# Altium footprint library Devkit.PcbLib: 84 footprints (part 6 of 6)
Each footprint in its own frame and in the unit in brackets; x right, y up, seen from the top. Pads: shape width x height; smd on the part's side, far side on the other; paste and mask are expansions set on the pad; w line width, h text height; cw(c..) or ccw(c..) is an arc to the next point about the centre after c.
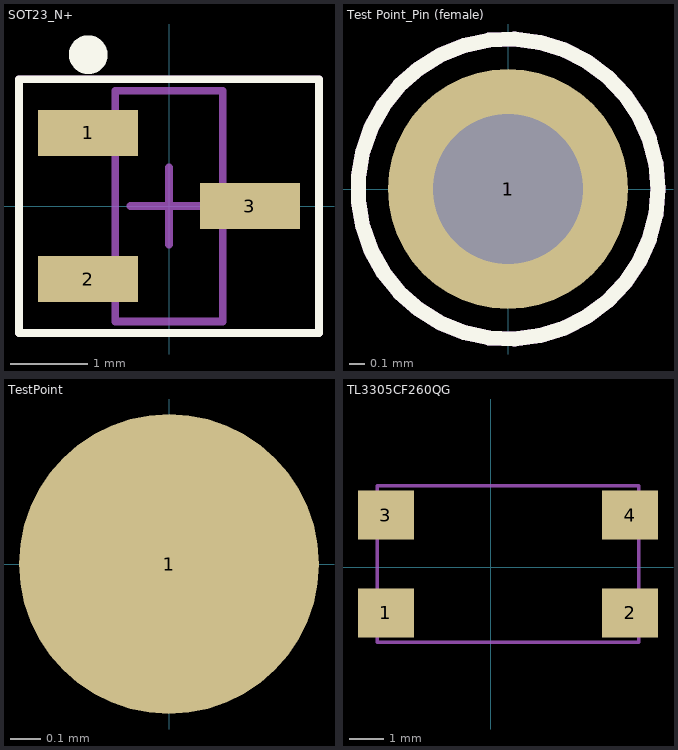
[diagram p5: the footprints below, top view; thin cyan lines are the x and y axes]

## SOT23_N+ [mm] "SOT23, 3-Leads, Body 2.9x1.3mm, Pitch 0.95mm, Lead Span 2.3mm, IPC Medium Density"
height 1.1
pads (3):
  rect 1.3x0.6 smd: 1(-1.05,0.95) 2(-1.05,-0.95) 3(1.05,0)
Top Overlay:
  lines w0.1: -1.95,-1.65 -1.95,1.65 1.95,1.65 1.95,-1.65 -1.95,-1.65
  lines w0.254: -0.927,1.943 cw(c-1.05,1.968) -0.926,1.985
Mechanical 13:
  lines w0.1: -0.7,-1.5 0.7,-1.5 0.7,1.5 -0.7,1.5 -0.7,-1.5
Mechanical 15:
  lines w0.1: -0.5,0 0.5,0 ; 0,-0.5 0,0.5 ; -1.95,-1.65 1.95,-1.65 1.95,1.65 -1.95,1.65 -1.95,-1.65
3D body: height 1.1, standoff 0, extent -0.7,-1.5 0.7,1.5

## Test Point_Pin (female) [mm] "1  Pin Header, pitch 2.54 mm"
pads (1):
  round 1.6 hole 1: 1(0,0)
Top Overlay:
  circle w0.1: c0,0 r1
Bottom Overlay:
  circle w0.1: c0,0 r1
Mechanical 13:
  circle w0.1: c0,0 r1
Mechanical 15:
  circle w0.1: c0,0 r1
  lines w0.1: -0.5,0 0.5,0 ; 0,-0.5 0,0.5

## TestPoint [mm] "1mm Pad"
pads (1):
  round 1 smd: 1(0,0)

## TL3305CF260QG [mm]
pads (4):
  rect 1.6x1.4 smd: 1(-3,-1.3) 2(4,-1.3) 3(-3,1.5) 4(4,1.5)
Mechanical 2:
  lines w0.1: -3.25,-2.15 -3.25,2.35 4.25,2.35 4.25,-2.15 -3.25,-2.15
3D body "TL3305CFxxxxG.stp": height 7, standoff 0, extent -3.25,-2.15 4.25,2.35